# Altium integrated library Mastermind Devices.IntLib: 910 symbols (part 1 of 6)
Pins are listed as number, name and electrical type; pins without a type are passive.

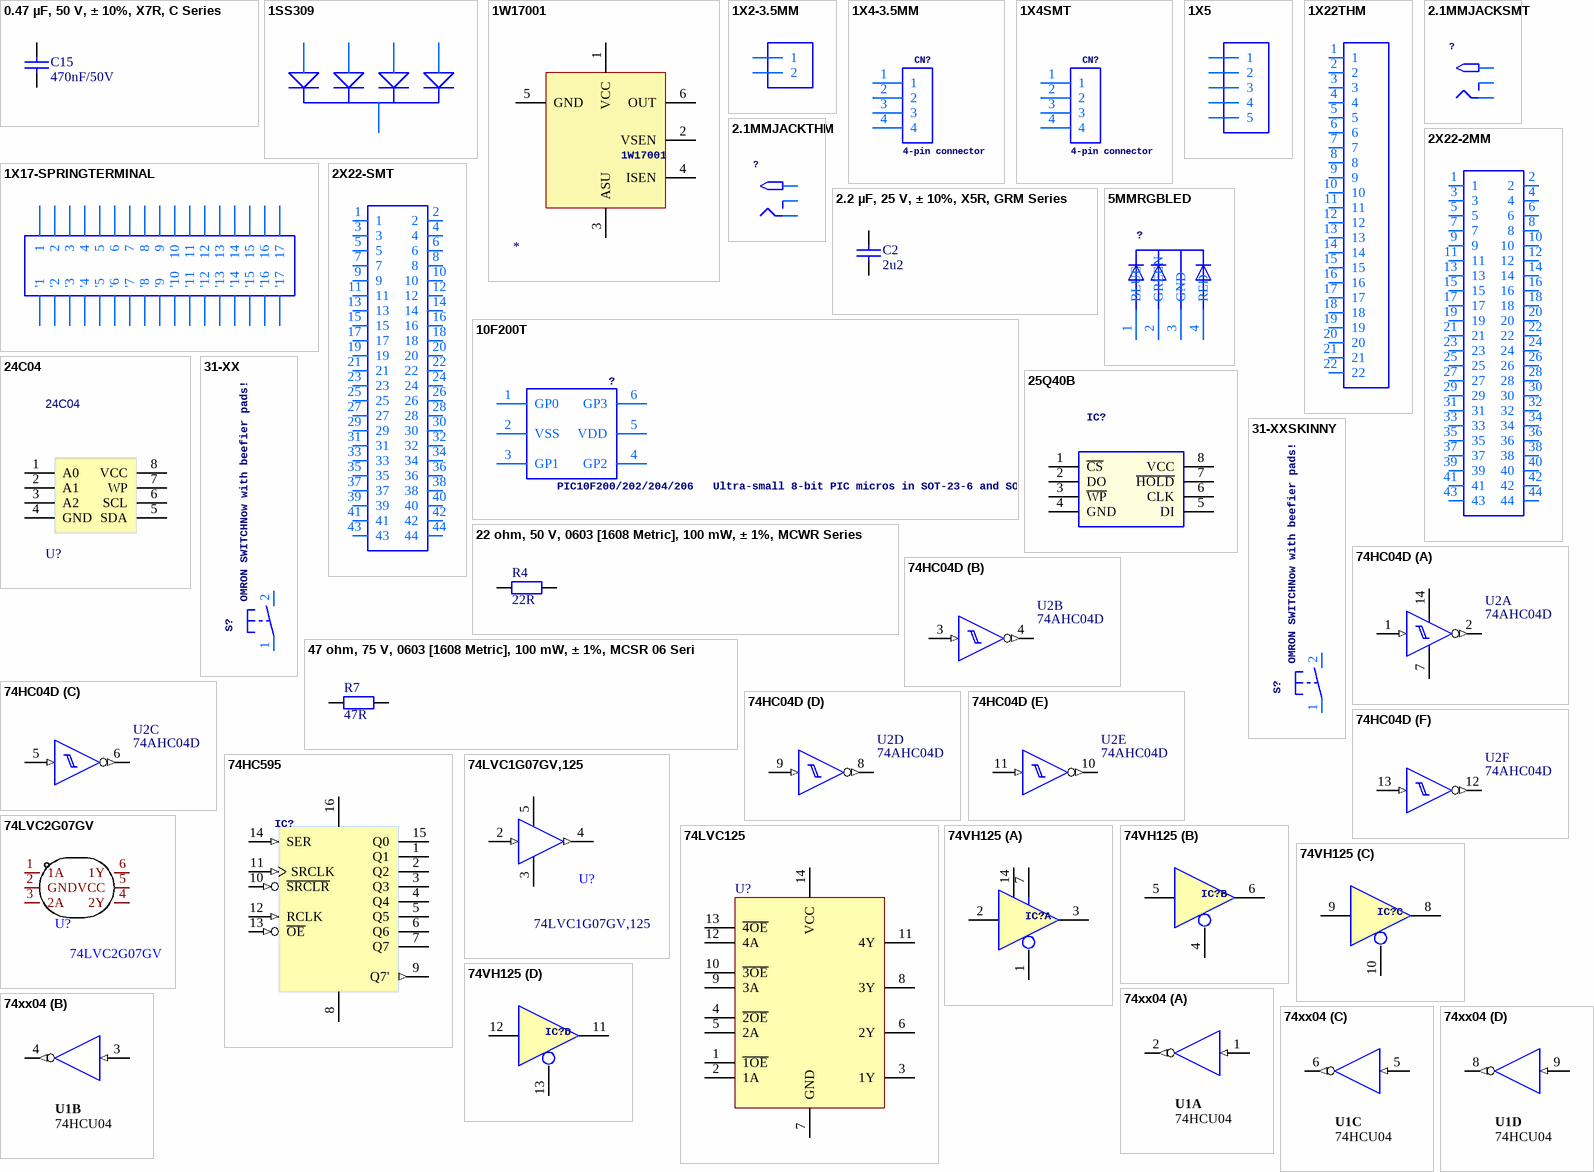
[diagram p0: symbols 0.47 µF, 50 V, ± 10%, X7R, C Series to 74xx04]

## 0.47 µF, 50 V, ± 10%, X7R, C Series
designator C15, comment 470nF/50V
SMD Multilayer Ceramic Capacitor, 0603 [1608 Metric], 0.47 µF, 50 V, ± 10%, X7R, C Series; MPN: C1608X7R1H474K080AC; Type: MLCC; VoltageRating: 50V; ComponentLinknDescription: Datasheet; MF: TDK; Capacitance: 470nF; Characteristic: *; ComponentLinknURL: *; Precision: 10%
footprint C0402 (0402 ceramic capacitor)
footprint C0603 (0603 ceramic capacitor)
footprint C0805 (0805 ceramic capacitor)
footprint C1206 (1206 ceramic capacitor)
footprint C1210 (1210 capacitor)
footprint C1812 (1812 capacitor)
pins: 1, 2

## 1SS309
designator D?
footprint SOT23-5L
pins: 1 A1, 2 C, 3 A2, 4 A3, 5 A4

## 1W17001
designator *
Parameter 1: *
pins: 1 VCC, 2 VSEN, 3 ASU, 4 ISEN, 5 GND, 6 OUT

## 1X2-3.5MM
designator J?, comment 3.5mm Terminal block    http://www.ladyada.net/library/pcb/eaglelibrary.html  (value not drawn)
footprint 1X2-3.5MM
pins: 1, 2

## 1X4-3.5MM
designator CN?, comment 4-pin connector
footprint 1X04-3.5MM
pins: 1, 2, 3, 4

## 1X4SMT
designator CN?, comment 4-pin connector
footprint 1X4-SMT
pins: 1, 2, 3, 4

## 1X5
designator J?
footprint 1X05-3.5MM
pins: 1, 2, 3, 4, 5

## 1X17-SPRINGTERMINAL
designator Q?
footprint SPRINGTERMINAL-17
pins: 1, 1' '1, 2, 2' '2, 3, 3' '3, 4, 4' '4, 5, 5' '5, 6, 6' '6, 7, 7' '7, 8, 8' '8, 9, 9' '9, 10, 10' '10, 11, 11' '11, 12, 12' '12, 13, 13' '13, 14, 14' '14, 15, 15' '15, 16, 16' '16, 17, 17' '17

## 1X22THM
designator ?
footprint 1X22
pins: 1, 2, 3, 4, 5, 6, 7, 8, 9, 10, 11, 12, 13, 14, 15, 16, 17, 18, 19, 20, 21, 22

## 2.1MMJACKSMT
designator ?, comment 2.1mm x 5.5mm THM DC jack with internal switch. Digikey part #PJ-102A, 4UCON part #05537  2.1mm x 5.5mm SMT DC jack with internal switch. Digikey part #PJ-002A-SMT, 4UCON part #03267    By microbuilder.eu & adafruit.com  (value not drawn)
footprint DCJACK_2MM_SMT
pins: GND RING, GNDBREAK RING_SW, PWR2 TIP

## 2.1MMJACKTHM
designator ?, comment 2.1mm x 5.5mm THM DC jack with internal switch. Digikey part #PJ-102A, 4UCON part #05537  2.1mm x 5.5mm SMT DC jack with internal switch. Digikey part #PJ-002A-SMT, 4UCON part #03267    By microbuilder.eu & adafruit.com  (value not drawn)
footprint PJ-102A
pins: RING, RING_SW, TIP

## 2.2 µF, 25 V, ± 10%, X5R, GRM Series
designator C2, comment 2u2
SMD Multilayer Ceramic Capacitor, 0603 [1608 Metric], 2.2 µF, 25 V, ± 10%, X5R, GRM Series; MPN: GRM188R61E225KA12D; Type: MLCC; Voltage rating: 50V; ComponentLinknDescription: Datasheet; MF: MURATA; Characteristic: *; ComponentLinknURL: *; Capacitance: 2u2; Precision: 10%
footprint C0402 (0402 ceramic capacitor)
footprint C0603 (0603 ceramic capacitor)
footprint C0805 (0805 ceramic capacitor)
footprint C1206 (1206 ceramic capacitor)
footprint C1210 (1210 capacitor)
footprint C1812 (1812 capacitor)
pins: 1, 2

## 2X22-2MM
designator ?
footprint 2X22
pins: 1, 2, 3, 4, 5, 6, 7, 8, 9, 10, 11, 12, 13, 14, 15, 16, 17, 18, 19, 20, 21, 22, 23, 24, 25, 26, 27, 28, 29, 30, 31, 32, 33, 34, 35, 36, 37, 38, 39, 40, 41, 42, 43, 44

## 2X22-SMT
designator ?
footprint 2X22-SMT
pins: 1, 2, 3, 4, 5, 6, 7, 8, 9, 10, 11, 12, 13, 14, 15, 16, 17, 18, 19, 20, 21, 22, 23, 24, 25, 26, 27, 28, 29, 30, 31, 32, 33, 34, 35, 36, 37, 38, 39, 40, 41, 42, 43, 44

## 5MMRGBLED
designator ?
footprint LED5MMRGB
pins: 1 BLUE, 2 GREEN, 3 GND, 4 RED

## 10F200T
designator ?, comment PIC10F200/202/204/206   Ultra-small 8-bit PIC micros in SOT-23-6 and SOIC
footprint SOT23-6
pins: 1 GP0, 2 VSS (power), 3 GP1, 4 GP2, 5 VDD (power), 6 GP3

## 22 ohm, 50 V, 0603 [1608 Metric], 100 mW, ± 1%, MCWR Series
designator R4, comment Resistance: 22R  (hidden comment: 22R / 100mW / 1%)
SMD Chip Resistor, Thick Film, 22 ohm, 50 V, 0603 [1608 Metric], 100 mW, ± 1%, MCWR Series; MPN: MCWR06X22R0FTLV; Temp coefficient: *ppm; MF: MULTICOMP; Precision: 1%; PowerRating: 100mW; Manufacturer: *; ComponentLinknURL: *
footprint R0402 (0402 resistor)
footprint R0603 (0603 resistor)
footprint R0805 (0805 resistor)
footprint R1206 (1206 resistor)
footprint R2512 (2512 resistor)
footprint R0201 (0201 resistor)
footprint R1210 (1210 resistor)
footprint R1812 (1812 resistor)
footprint R2010 (2010 resistor)
footprint R2512 (2512 resistor)
pins: 1, 2

## 24C04
designator U?
24C04 EEPROM; Manufacturer: HK(航顺); Manufacturer Part: HK24C04; Contributor: LCSC; Supplier: LCSC; Supplier Part: C495285; JLCPCB Part Class: Extended Part; spicePre: U; spiceSymbolName: HK24C04
footprint SOP8
pins: 1 A0, 2 A1, 3 A2, 4 GND, 5 SDA, 6 SCL, 7 WP, 8 VCC

## 25Q40B
designator IC?
footprint SOIC-8E (SOIC, 8-Leads, Body 4.90x3.90mm, Pitch 1.27mm, IPC Medium Density)
pins: 1 ~{CS}, 2 DO, 3 ~{WP}, 4 GND, 5 DI, 6 CLK, 7 ~{HOLD}, 8 VCC

## 31-XX
designator S?, comment OMRON SWITCHNow with beefier pads!
footprint B3F-31XX
pins: 1 P, 2 S

## 31-XXSKINNY
designator S?, comment OMRON SWITCHNow with beefier pads!
footprint B3F-31XX-SKINNIER
pins: 1 P, 2 S

## 47 ohm, 75 V, 0603 [1608 Metric], 100 mW, ± 1%, MCSR 06 Series
designator R7, comment Resistance: 47R  (hidden comment: 47R /  / 1%)
SMD Chip Resistor, Ceramic, 47 ohm, 75 V, 0603 [1608 Metric], 100 mW, ± 1%, MCSR 06 Series; MPN: MCSR06X47R0FTL; Temp coefficient: *ppm; MF: MULTICOMP; Precision: 1%; Manufacturer: *; ComponentLinknURL: *
footprint R0402 (0402 resistor)
footprint R0603 (0603 resistor)
footprint R0805 (0805 resistor)
footprint R1206 (1206 resistor)
footprint R2512 (2512 resistor)
footprint R0201 (0201 resistor)
footprint R1210 (1210 resistor)
footprint R1812 (1812 resistor)
footprint R2010 (2010 resistor)
footprint R2512 (2512 resistor)
pins: 1, 2

## 74HC04D
designator U2, comment 74AHC04D
Inverter IC 6 Channel 14-SOIC; BOM_Manufacturer: TI(德州仪器); subpart_no: 1; Contributor: LCSC; BOM_Supplier: LCSC; BOM_JLCPCB Part Class: Extended Part; spicePre: U; spiceSymbolName: SN74AHCT1G125DBVT DH
footprint SOIC127P600X175-14N
part A pins: 1 A (in), 2 Y (out), 7 GND, 14 VCC
part B pins: 3 A (in), 4 Y (out)
part C pins: 5 A (in), 6 Y (out)
part D pins: 8 Y (out), 9 A (in)
part E pins: 10 Y (out), 11 A (in)
part F pins: 12 Y (out), 13 A (in)

## 74HC595
designator IC?  (value not drawn)
Shift Register; GateName_1: G$1; SymbolName_1: MAX232
footprint SO-16
pins: 1 Q1, 2 Q2, 3 Q3, 4 Q4, 5 Q5, 6 Q6, 7 Q7, 8 GND, 9 Q7' (out), 10 ~{SRCLR} (in), 11 SRCLK (in), 12 RCLK (in), 13 ~{OE} (in), 14 SER (in), 15 Q0, 16 VCC

## 74LVC1G07GV,125
designator U?
Manufacturer: Nexperia(安世); Add into BOM: yes; output type: Open Drain; Supply Voltage: 1.65V~5.5V; Number of Elements: 1; Sink Current: 32mA; Logic Family: 74LVC; Symbol: 74LVC1G07GV,125; Device: 74LVC1G07GV,125; LCSC Part Name: 74LVC1G07GV,125; Supplier Part: C12511; Manufacturer Part: 74LVC1G07GV,125; Supplier Footprint: SOT-753; JLCPCB Part Class: Extended Part; Datasheet: https://atta.szlcsc.com/upload/public/pdf/source/20130521/1457706602667.pdf; Supplier: LCSC; Convert to PCB: yes; Number of Bits per Element: 1; Operating Temperature: -40℃~+125℃
footprint SOT23-5L
pins: 2 A (in), 3 GND, 4 Y (out), 5 VCC

## 74LVC2G07GV
designator U?
Manufacturer: TECH PUBLIC(台舟); Add into BOM: yes; Symbol: 74LVC2G07GV; Device: 74LVC2G07GV; LCSC Part Name: 74LVC2G07GV; Supplier Part: C19829597; Manufacturer Part: 74LVC2G07GV; Supplier Footprint: SOT-23-6; Datasheet: https://atta.szlcsc.com/upload/public/pdf/source/20240202/A0B51486A7A10E25A0B1630C875E8EFF.pdf; Supplier: LCSC; Convert to PCB: yes
footprint SOT23-6
pins: 1 1A, 2 GND, 3 2A, 4 2Y, 5 VCC, 6 1Y

## 74LVC125
designator U?, comment LOGIC LEVEL CONVERTER  (value not drawn)
XCF00S Series, Platform Flash In-System Programmable Configuration 3.3V PROM, 20-Pin TSOP, 2-Megabit, Commercial Grade; PackageDocument: ver1.0, May-2003; AEMS Code: CHANGED VALUE; DatasheetDocument: ver2.3, May-2004; PackageReference: VO20; Code_JEDEC: MO-153-AC
footprint TSSOP14
pins: 1 ~{1OE} "Configuration Pulse (Open-Drain Output).", 2 1A "Ground", 3 1Y "Leave Unconnected.", 4 ~{2OE} "Configuration Pulse (Open-Drain Output).", 5 2A "Ground", 6 2Y "Leave Unconnected.", 7 GND (power) "Ground", 8 3Y "Leave Unconnected.", 9 3A "Ground", 10 ~{3OE} "Configuration Pulse (Open-Drain Output).", 11 4Y "Serial Data Output, for configuring an FPGA in serial mode.", 12 4A "Ground", 13 ~{4OE} "Configuration Pulse (Open-Drain Output).", 14 VCC (power) "Ground"

## 74VH125
designator IC?, comment Quad bus BUFFER, 3-state  (value not drawn)
footprint TSSOP14
part A pins: 1 OE, 2 I, 3 O (hiz), 7 I, 14 I
part B pins: 4 OE, 5 I, 6 O (hiz)
part C pins: 8 O (hiz), 9 I, 10 OE
part D pins: 11 O (hiz), 12 I, 13 OE

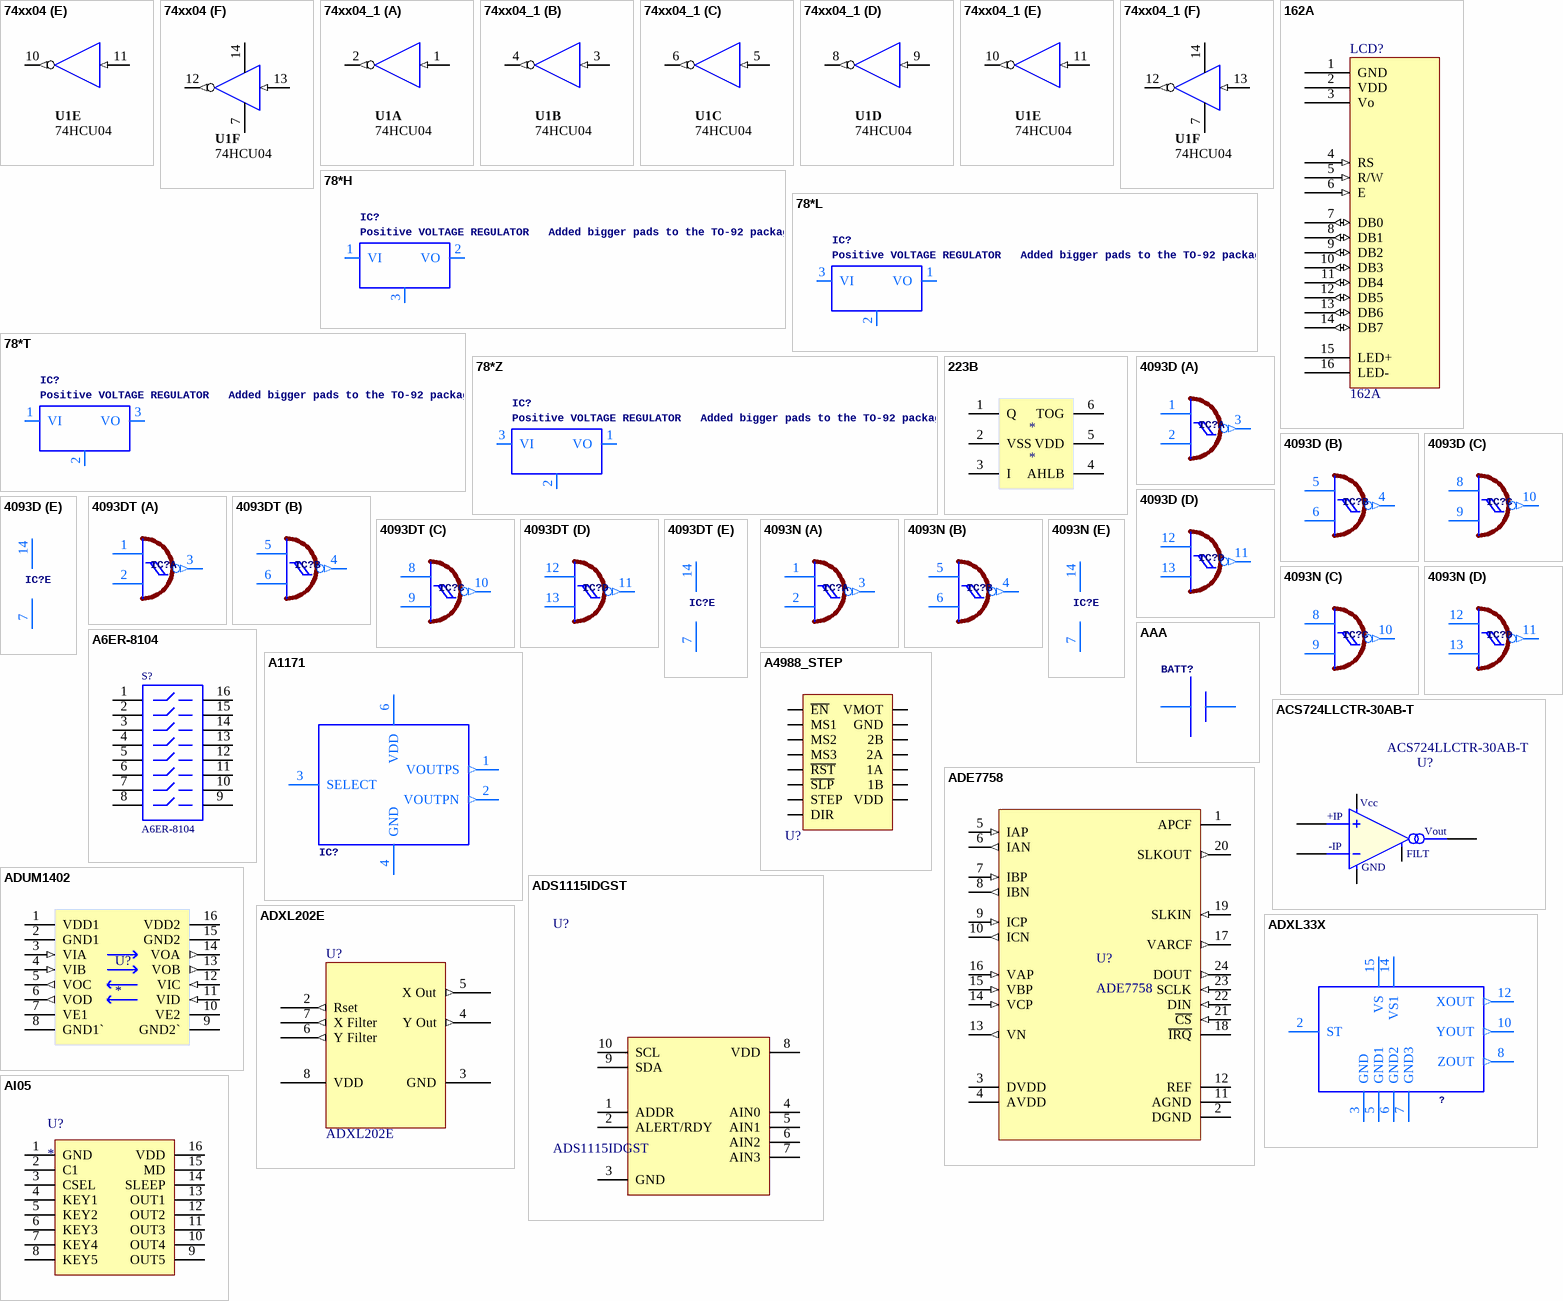
[diagram p1: symbols 74xx04 to AI05]

## 74xx04
designator U1, comment 74HCU04
74HCU04, HEX Inverter, Unbuffered; Mounting Technology: Surface Mount; Status: Production; Category: IC-Logic
footprint SOIC127P600-14
footprint TSSOP14
part A pins: 1 A (in), 2 Y (out)
part B pins: 3 A (in), 4 Y (out)
part C pins: 5 A (in), 6 Y (out)
part D pins: 8 Y (out), 9 A (in)
part E pins: 10 Y (out), 11 A (in)
part F pins: 7 GND (power), 12 Y (out), 13 A (in), 14 VCC (power)

## 74xx04_1
designator U1, comment 74HCU04
74HCU04, HEX Inverter, Unbuffered; Mounting Technology: Surface Mount; Status: Production; Category: IC-Logic
footprint SOIC127P600-14
footprint TSSOP14
part A pins: 1 A (in), 2 Y (out)
part B pins: 3 A (in), 4 Y (out)
part C pins: 5 A (in), 6 Y (out)
part D pins: 8 Y (out), 9 A (in)
part E pins: 10 Y (out), 11 A (in)
part F pins: 7 GND (power), 12 Y (out), 13 A (in), 14 VCC (power)

## 78*H
designator IC?, comment Positive VOLTAGE REGULATOR   Added bigger pads to the TO-92 package
footprint TO39
pins: 1 VI, 2 VO, 3 GND

## 78*L
designator IC?, comment Positive VOLTAGE REGULATOR   Added bigger pads to the TO-92 package
footprint TO92
pins: 1 VO, 2 GND, 3 VI

## 78*T
designator IC?, comment Positive VOLTAGE REGULATOR   Added bigger pads to the TO-92 package
footprint TO220H
pins: 1 VI, 2 GND, 3 VO

## 78*Z
designator IC?, comment Positive VOLTAGE REGULATOR   Added bigger pads to the TO-92 package
footprint TO92
pins: 1 VO, 2 GND, 3 VI

## 162A
designator LCD?
16 char * 2 line LCD character display with b/light
3D model 162a (PCB3D Model)
footprint 162A
pins: 1 GND (power) "VSS - 0V", 2 VDD (power) "VDD - 5V", 3 Vo (hiz) "Input Voltage For LCD", 4 RS (in) "H = Data Signal, L = Instrunction Signal", 5 R/W (in) "H = Read Mode, L = Write Mode", 6 E (in) "Chip Enable (H, H->L)", 7 DB0 (io) "Chip Enable (H, H->L)", 8 DB1 (io) "Chip Enable (H, H->L)", 9 DB2 (io) "Chip Enable (H, H->L)", 10 DB3 (io) "Chip Enable (H, H->L)", 11 DB4 (io) "Chip Enable (H, H->L)", 12 DB5 (io) "Chip Enable (H, H->L)", 13 DB6 (io) "Chip Enable (H, H->L)", 14 DB7 (io) "Chip Enable (H, H->L)", 15 LED+ (power) "LED Backlight +", 16 LED- (power) "LED Backlight -"

## 223B
designator *
footprint SOT23-6
pins: 1 Q, 2 VSS, 3 I, 4 AHLB, 5 VDD, 6 TOG

## 4093D
designator IC?, comment Quad 2-input NAND schmitt trigger  (value not drawn)
footprint SO14
part A pins: 1 I0, 2 I1, 3 O (out)
part B pins: 4 O (out), 5 I0, 6 I1
part C pins: 8 I0, 9 I1, 10 O (out)
part D pins: 11 O (out), 12 I0, 13 I1
part E pins: 7 VSS (power), 14 VDD (power)

## 4093DT
designator IC?, comment Quad 2-input NAND schmitt trigger  (value not drawn)
footprint MC14093B-TSSOP14
part A pins: 1 I0, 2 I1, 3 O (out)
part B pins: 4 O (out), 5 I0, 6 I1
part C pins: 8 I0, 9 I1, 10 O (out)
part D pins: 11 O (out), 12 I0, 13 I1
part E pins: 7 VSS (power), 14 VDD (power)

## 4093N
designator IC?, comment Quad 2-input NAND schmitt trigger  (value not drawn)
footprint DIL14
part A pins: 1 I0, 2 I1, 3 O (out)
part B pins: 4 O (out), 5 I0, 6 I1
part C pins: 8 I0, 9 I1, 10 O (out)
part D pins: 11 O (out), 12 I0, 13 I1
part E pins: 7 VSS (power), 14 VDD (power)

## A6ER-8104
designator S?
DIP Switch Side actuator long liver Piano Key; Revision: July-2002: Re-released for DXP Platform.
footprint DIP-16-KEY
simulation model dpsw8 (Spice Subcircuit)
3D model SWITCH_DIP8 (PCB3D Model)
pins: 1, 2, 3, 4, 5, 6, 7, 8, 9, 10, 11, 12, 13, 14, 15, 16

## A1171
designator IC?, comment A1171 Allegro push-pull hall effect sensor  (value not drawn)
footprint DFN-6
pins: 1 VOUTPS (out), 2 VOUTPN (out), 3 SELECT, 4 GND (power), 6 VDD (power)

## A4988_STEP
designator U?  (value not drawn)
GateName_1: G$1; SymbolName_1: A4988_STEP; LibraryName: IC; DeviceSetName: A4988_STEP; Package: A4988_STEP
footprint A4988_STEP
pins: 1A, 1B, 2A, 2B, /EN ~{EN}, /RST ~{RST}, /SLP ~{SLP}, DIR, GND, MS1, MS2, MS3, STEP, VDD, VMOT

## AAA
designator BATT?, comment AAA PC pin holder   Mouser part #12BH412 - but pretty much any 1x AAA battery holder should be the same    http://www.ladyada.net/library/pcb/eaglelibrary.html  (value not drawn)
footprint 12BH412
pins: +, -

## ACS724LLCTR-30AB-T
designator U?
Manufacturer: ALLEGRO(美国埃戈罗); Add into BOM: yes; Current Range: 30A; Supply Voltage: 4.5V~5.5V; Sensitivity: 66mV/A; Symbol: ACS724LLCTR-30AB-T; Device: ACS724LLCTR-30AB-T; LCSC Part Name: ACS724LLCTR-30AB-T; Supplier Part: C141715; Manufacturer Part: ACS724LLCTR-30AB-T; Supplier Footprint: SOIC-8; JLCPCB Part Class: Extended Part; Datasheet: https://atta.szlcsc.com/upload/public/pdf/source/20200518/C459328_30972F681B164683FED19A924BE04160.pdf; Supplier: LCSC; Convert to PCB: yes; Operating Temperature: -40℃~+150℃
footprint SOIC-8_L4.9-W3.9-P1.27-LS6.0-BL; pin to pad 1>1+2 3>3+4
pins: 1 A+, 3 A-, 5 GND, 6 OA, 7 OA, 8 VCC
text: Vcc; +IP; Vout; -IP; FILT

## ADE7758
designator U?
footprint SOIC24 (SOIC, 8-Leads, Body 4.90x3.90mm, Pitch 1.27mm, IPC Medium Density)
pins: 1 APCF, 2 DGND, 3 DVDD, 4 AVDD, 5 IAP (in), 6 IAN (out), 7 IBP (in), 8 IBN (out), 9 ICP (in), 10 ICN (out), 11 AGND, 12 REF, 13 VN (out), 14 VCP (in), 15 VBP (in), 16 VAP (in), 17 VARCF (out), 18 ~{IRQ}, 19 SLKIN (in), 20 SLKOUT (out), 21 ~{CS} (in), 22 DIN (in), 23 SCLK (in), 24 DOUT (out)

## ADS1115IDGST
designator U?
16-Bit Analog to digital Converter; DETAILS: 16 Bit Analog to Digital Converter 2, 4 Input 1 Sigma-Delta 10-VSSOP; MFG: Texas Instruments; VALUE: 16 Bit Analog to Digital Converter; MFGPN: ADS1115IDGST; PACKAGE: 10VSSOP; URL: https://www.digikey.com/en/products/detail/texas-instruments/ADS1115IDGST/2123284?s=N4IgTCBcDaIIIBEDKBGNBWAkgg4kgKiALoC%2BQA
footprint SOP50P490X110-10N
footprint SOP50P490X110-10N
pins: 1 ADDR, 2 ALERT/RDY, 3 GND (power), 4 AIN0, 5 AIN1, 6 AIN2, 7 AIN3, 8 VDD (power), 9 SDA, 10 SCL

## ADUM1402
designator U?
General Purpose Digital Isolator 2500Vrms 4 Channel 1Mbps 25kV/Âµs CMTI 16-SOIC (0.295, 7.50mm Width); MP: ADUM1402; MF: Analog Devices; Value: *; Check_prices: https://www.snapeda.com/parts/ADUM1402/Analog%20Devices%20Inc./view-part/564744/?ref=eda; Package: SOIC-16 Analog Devices; Availability: Bad; Price: None; SnapEDA_Link: https://www.snapeda.com/parts/ADUM1402/Analog%20Devices%20Inc./view-part/564744/?ref=snap
footprint SO16W
pins: 1 VDD1 (power), 2 GND1 (power), 3 VIA (in), 4 VIB (in), 5 VOC (out), 6 VOD (out), 7 VE1, 8 GND1` (power), 9 GND2` (power), 10 VE2, 11 VID (in), 12 VIC (in), 13 VOB (out), 14 VOA (out), 15 GND2 (power), 16 VDD2 (power)

## ADXL33X
designator ?
footprint 16LCSP
pins: 2 ST, 3 GND (oe), 5 GND1 (oe), 6 GND2 (oe), 7 GND3 (oe), 8 ZOUT (out), 10 YOUT (out), 12 XOUT (out), 14 VS1 (oe), 15 VS (oe)

## ADXL202E
designator U?
Accelerometer with Digital Output
footprint E-8
pins: 1 Self Test (in) hidden, 2 Rset (out), 3 GND (power), 4 Y Out (out), 5 X Out (out), 6 Y Filter (out), 7 X Filter (out), 8 VDD (power)

## AI05
designator U?
SOP-16_L10.0-W3.9-P1.27-LS6.0-BL; MF: Vishay Semiconductor; MP: TCMT4606; Digi-Key_Part_Number: TCMT4606CT-ND; DigiKey-Purchase-URL: https://snapeda.com/shop?store=DigiKey&id=649284; Package: SOP-16 Vishay; Value: *; SnapEDA_Link: https://www.snapeda.com/parts/TCMT4606/Vishay%20Semiconductor%20Opto%20Division/view-part/649284/?ref=snap
footprint SO-16
pins: 1 GND, 2 C1, 3 CSEL, 4 KEY1, 5 KEY2, 6 KEY3, 7 KEY4, 8 KEY5, 9 OUT5, 10 OUT4, 11 OUT3, 12 OUT2, 13 OUT1, 14 SLEEP, 15 MD, 16 VDD

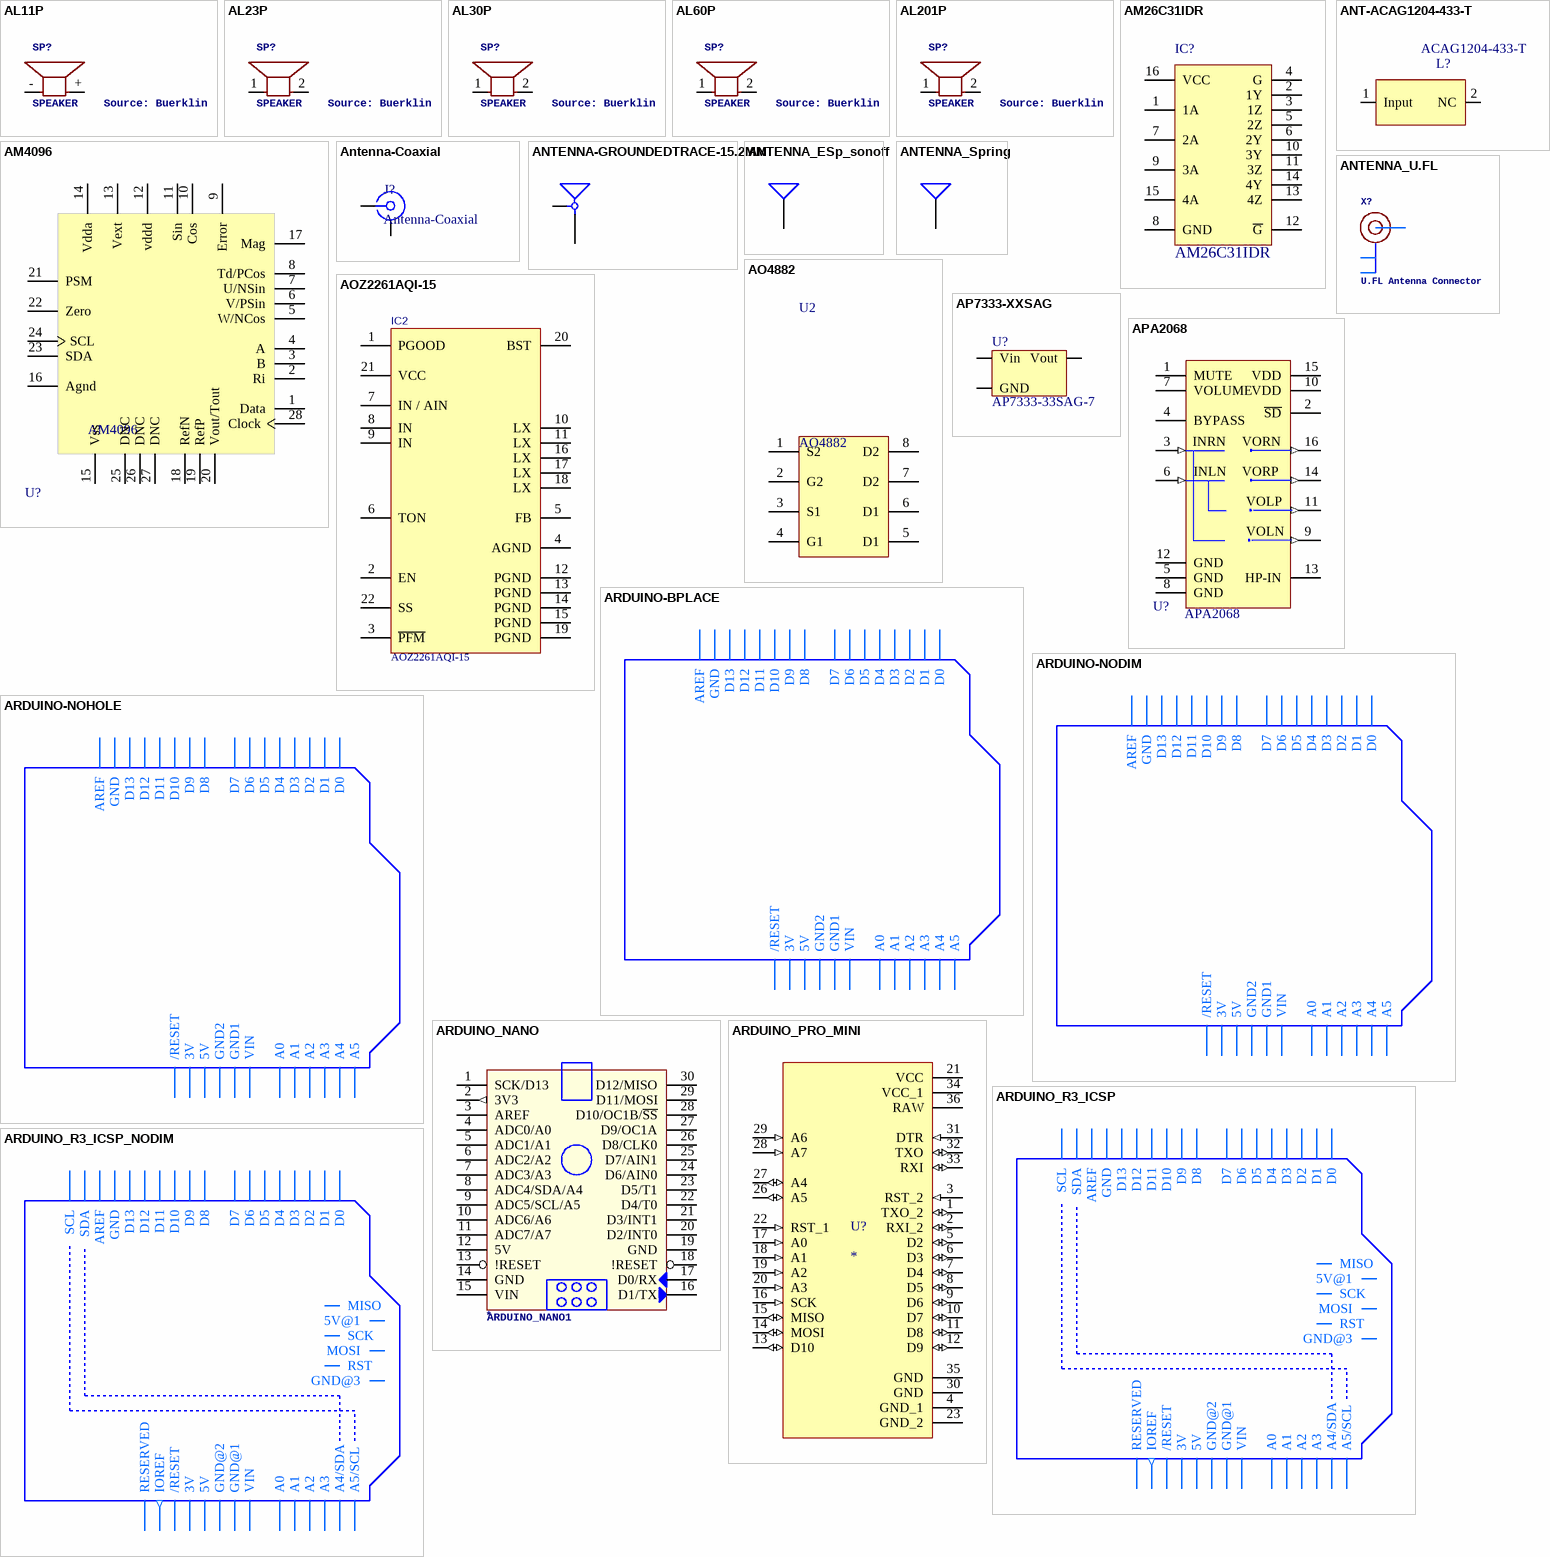
[diagram p2: symbols AL11P to ARDUINO_R3_ICSP_NODIM]

## AL11P
designator SP?, comment SPEAKER    Source: Buerklin
OC_FARNELL: unknown; OC_NEWARK: unknown
footprint AL11P
pins: + 2, - 1

## AL23P
designator SP?, comment SPEAKER    Source: Buerklin
OC_FARNELL: unknown; OC_NEWARK: unknown
footprint AL23P
pins: 1, 2

## AL30P
designator SP?, comment SPEAKER    Source: Buerklin
OC_FARNELL: unknown; OC_NEWARK: unknown
footprint AL30P
pins: 1, 2

## AL60P
designator SP?, comment SPEAKER    Source: Buerklin
OC_FARNELL: unknown; OC_NEWARK: unknown
footprint AL60P
pins: 1, 2

## AL201P
designator SP?, comment SPEAKER    Source: Buerklin
OC_FARNELL: unknown; OC_NEWARK: unknown
footprint AL201P
pins: 1, 2

## AM26C31IDR
designator IC?
SOIC-16 Buffers, Drivers, Receivers, Transceivers ROHS
footprint SO-16
pins: 1 1A, 2 1Y, 3 1Z, 4 G, 5 2Z, 6 2Y, 7 2A, 8 GND, 9 3A, 10 3Y, 11 3Z, 12 ~{G}, 13 4Z, 14 4Y, 15 4A, 16 VCC

## AM4096
designator U?
Integrated Circuit
footprint SOP65P780X200-28N
pins: 1 Data, 2 Ri, 3 B, 4 A, 5 W/NCos, 6 V/PSin, 7 U/NSin, 8 Td/PCos, 9 Error, 10 Cos, 11 Sin, 12 vddd, 13 Vext, 14 Vdda, 15 Vss, 16 Agnd, 17 Mag, 18 RefN, 19 RefP, 20 Vout/Tout, 21 PSM, 22 Zero, 23 SDA, 24 SCL, 25 DNC, 26 DNC, 27 DNC, 28 Clock

## ANT-ACAG1204-433-T
designator L?, comment ACAG1204-433-T
2 Chip Antenna -1.72dBi 433MHz SMD,12x4mm Antennas ROHS; Manufacturer: ABRACON; Add into BOM: yes; VSWR: 2; Symbol: ACAG1204-433-T; Device: ACAG1204-433-T; LCSC Part Name: ACAG1204-433-T; Supplier Part: C6113830; Manufacturer Part: ACAG1204-433-T; Supplier Footprint: SMD,12x4mm; JLCPCB Part Class: Extended Part; Datasheet: https://atta.szlcsc.com/upload/public/pdf/source/20240327/80E5ABA0D6706D2FCBCF1E29EBE2A1AE.pdf; Supplier: LCSC; Convert to PCB: yes; Antenna Type: Chip Antenna; Central Frequency: 433MHz; Peak Gain: -1.72dBi
footprint ANT-SMD_L12.0-W4.0_ACAG1204-915-T
3D model ANT-SMD_L12.0-W4.0_ACAG1204-915-T
pins: 1 Input, 2 NC

## Antenna-Coaxial
designator J?
pins: 1 Signal, 2 GND/SHIELD

## ANTENNA-GROUNDEDTRACE-15.2MM
designator E?  (net tie, no BOM)
Inverted F TRACE_ANTENNA_2.4GHZ_25.7MM
footprint TRACE_ANTENNA_2.4GHZ_15.2MM
pins: ANT A, GND

## ANTENNA_ESp_sonoff
designator ANT?  (net tie, no BOM)
Meander
footprint ANT-ESP12F- sonoff
pins: FEED A

## ANTENNA_Spring
designator ANT?  (net tie, no BOM)
Spring
footprint ANT-SPRING
pins: FEED A

## ANTENNA_U.FL
designator X?, comment U.FL Antenna Connector
footprint U.FL
pins: 1 GND@0, 2 GND@1, 3 SIGNAL

## AO4882
designator U2
40V Dual N-Channel Mosfet
footprint SOP127P600X170-8L (SOP, 8-Leads, Body 4,90x3,90mm, Pitch 1,27mm, IPC High Density)
pins: 1 S2, 2 G2, 3 S1, 4 G1, 5 D1, 6 D1, 7 D2, 8 D2

## AOZ2261AQI-15
designator IC2
8A (Iout(max)) Synchronous Buck Regulator, QFN-22L (4mmx 4mm), Vin = 4V to 28V; Manufacturer Name: Alpha and Omega; Manufacturer Part No.: AOZ2261AQI-15
footprint T_QFN50P400X400X100-22N
pins: 1 PGOOD (power), 2 EN (power), 3 ~{PFM} (power), 4 AGND (power), 5 FB (power), 6 TON (power), 7 IN / AIN (power), 8 IN (power), 9 IN (power), 10 LX (power), 11 LX (power), 12 PGND (power), 13 PGND (power), 14 PGND (power), 15 PGND (power), 16 LX (power), 17 LX (power), 18 LX (power), 19 PGND (power), 20 BST (power), 21 VCC (power), 22 SS (power)

## AP7333-XXSAG
designator U?, comment AP7333-33SAG-7
300mA, Low Quiescent Current, Fast Transient Low Dropout Linear Regulator; Manufacturer: Diodes Incorporated; Artikkelnr Noca: 17039216; Artikkelnr Simpro: N.A.; Part Number: AP7333-33SAG-7; Manufacturer Part Number: AP7333-33SAG-7; Datasheet: http://www.diodes.com/datasheets/AP7333.pdf; LatestRevisionDate: 2012-06-15; Pin Count: 3; Publisher: Nordic Semiconductor; Published: 2012-06-15; Value: AP7333-33SAG-7; Note: *; Supplier: Digi-Key; Supplier part number: AP7333-33SAG-7DICT-ND; 2nd source Supplier: *; 2nd source part number: *; Footprint Doc: SOT-23-3
footprint SOT-23A
pins: 1 Vin, 2 Vout, 3 GND

## APA2068
designator U?
Class AB 2-Channel (Stereo) 2.9W x 2 @ 3Ω 4.5 V ~ 5.5 V SOIC-16_150mil Audio Power OpAmps RoHS; GateName_1: G$1; SymbolName_1: APA2068
footprint SO-16
pins: 1 MUTE, 2 ~{SD}, 3 T1IN (in), 4 BYPASS, 5 GND (power), 6 T2IN (in), 7 VOLUME, 8 GND (power), 9 VOLN (out), 10 VDD (power), 11 VOLP (out), 12 GND, 13 HP-IN, 14 VORP (out), 15 VDD (power), 16 VORN (out)
text: INRN; INLN

## ARDUINO-BPLACE
designator ?, comment Arduino Diecimila/Duemilanove   Make a shield with ease, this package has all the named pins as well as the two mounting drill holes and an outline of the USB and DC power connector. The outline is on the DIMENSION layer, so if your board house uses it they will cut the outline to match.    http://www.ladyada.net/library/pcb/eaglelibrary.html  (value not drawn)
footprint ARDUINO-BPLACE
pins: 3V (power), 5V (power), A0, A1, A2, A3, A4, A5, AREF, D0, D1, D2, D3, D4, D5, D6, D7, D8, D9, D10, D11, D12, D13, GND (power), GND1 (power), GND2 (power), RESET /RESET, VIN (power)

## ARDUINO-NODIM
designator ?, comment Arduino Diecimila/Duemilanove   Make a shield with ease, this package has all the named pins as well as the two mounting drill holes and an outline of the USB and DC power connector. The outline is on the DIMENSION layer, so if your board house uses it they will cut the outline to match.    http://www.ladyada.net/library/pcb/eaglelibrary.html  (value not drawn)
footprint ARDUINO-NODIM
pins: 3V (power), 5V (power), A0, A1, A2, A3, A4, A5, AREF, D0, D1, D2, D3, D4, D5, D6, D7, D8, D9, D10, D11, D12, D13, GND (power), GND1 (power), GND2 (power), RESET /RESET, VIN (power)

## ARDUINO-NOHOLE
designator ?, comment Arduino Diecimila/Duemilanove   Make a shield with ease, this package has all the named pins as well as the two mounting drill holes and an outline of the USB and DC power connector. The outline is on the DIMENSION layer, so if your board house uses it they will cut the outline to match.    http://www.ladyada.net/library/pcb/eaglelibrary.html  (value not drawn)
footprint ARDUINO-NOHOLE
pins: 3V (power), 5V (power), A0, A1, A2, A3, A4, A5, AREF, D0, D1, D2, D3, D4, D5, D6, D7, D8, D9, D10, D11, D12, D13, GND (power), GND1 (power), GND2 (power), RESET /RESET, VIN (power)

## ARDUINO_NANO
designator ARDUINO_NANO1  (value not drawn)
Arduino Nano V3.0 ModuleOverview:The Arduino Nano is a small, complete, and breadboard-friendly board based on the ATmega328 (Arduino Nano 3.x) or ATmega168 (Arduino Nano 2.x). It has more or less the same functionality of the Arduino Duemilanove, but in a different package.It lacks only a DC power jack, and works with a Mini-B USB cable instead of a standard one.The Nano was designed and is being produced by Gravitech.  General specifications:    Item    Value        Microcontroller    Atmel ATmega168 or ATmega328        Operating Voltage (logic level)    5 V        Input Voltage (recommended)    7-12 V      Input Voltage (limits)    6-20 V      Digital I/O Pins    14 (of which 6 provide PWM output)      Analog Input Pins    8      DC Current per I/O Pin    40 mA        Flash Memory    16 KB (ATmega168) or 32 KB (ATmega328) of which 2 KB used by bootloader        SRAM    1 KB (ATmega168) or 2 KB (ATmega328)        EEPROM    512 bytes (ATmega168) or 1 KB (ATmega328)        Clock Speed    16 MHz        Dimensions (Inches)     0.73" x 1.70"        Dimensions (mm)     18mm x 45mm        Overall height    About 9 mm (not including pins)        Weigth    5 g  Power:The Arduino Nano can be powered via the Mini-B USB connection, 6-20V unregulated external power supply (pin 30), or 5V regulated external power supply (pin 27).The power source is automatically selected to the highest voltage source.Memory:The ATmega168 has 16 KB of flash memory for storing code (of which 2 KB is used for the bootloader); the ATmega328 has 32 KB, (also with 2 KB used for the bootloader).The ATmega168 has 1 KB of SRAM and 512 bytes of EEPROM (which can be read and written with the EEPROM library); the ATmega328 has 2 KB of SRAM and 1 KB of EEPROM.Input and Output:Each of the 14 digital pins on the Nano can be used as an input or output, using pinMode(), digitalWrite(), and digitalRead() functions.They operate at 5 volts.Each pin can provide or receive a maximum of 40 mA and has an internal pull-up resistor (disconnected by default) of 20-50 kOhms. In addition, some pins have specialized functions.Visit Arduino - ArduinoBoardNano; GateName_1: G$1; SymbolName_1: ARDUINO_NANO; LibraryName: ArduinoNanoV30; DeviceSetName: ARDUINO_NANO; NAME: *
footprint ARDUINO_NANO
pins: 1 SCK/D13, 2 3V3 (out), 3 AREF, 4 ADC0/A0, 5 ADC1/A1, 6 ADC2/A2, 7 ADC3/A3, 8 ADC4/SDA/A4, 9 ADC5/SCL/A5, 10 ADC6/A6, 11 ADC7/A7, 12 5V (power), 13 !RESET, 14 GND (power), 15 VIN (power), 16 D1/TX, 17 D0/RX, 18 !RESET, 19 GND (power), 20 D2/INT0, 21 D3/INT1, 22 D4/T0, 23 D5/T1, 24 D6/AIN0, 25 D7/AIN1, 26 D8/CLK0, 27 D9/OC1A, 28 D10/OC1B/~{SS}, 29 D11/MOSI, 30 D12/MISO

## ARDUINO_PRO_MINI
designator U?
This board was developed for applications and installations where space is premium and projects are made as permanent set ups. Small, available in 3.3 V and 5 V versions, powered by ATmega328P.; MP: Arduino Pro Mini; MF: Arduino; Price: None; Availability: Not in stock; Package: None; Value: *; SnapEDA_Link: https://www.snapeda.com/parts/Arduino%20Pro%20Mini/Arduino/view-part/?ref=snap; Check_prices: https://www.snapeda.com/parts/Arduino%20Pro%20Mini/Arduino/view-part/?ref=eda
footprint MODULE_ARDUINO_PRO_MINI
pins: 1 TXO_2 (io), 2 RXI_2 (io), 3 RST_2 (in), 4 GND_1 (power), 5 D2 (io), 6 D3 (io), 7 D4 (io), 8 D5 (io), 9 D6 (io), 10 D7 (io), 11 D8 (io), 12 D9 (io), 13 D10 (io), 14 MOSI (io), 15 MISO (io), 16 SCK (in), 17 A0 (in), 18 A1 (in), 19 A2 (in), 20 A3 (in), 21 VCC (power), 22 RST_1 (in), 23 GND_2 (power), 26 A5 (io), 27 A4 (io), 28 A7 (in), 29 A6 (in), 30 GND (power), 31 DTR (in), 32 TXO (io), 33 RXI (io), 34 VCC_1 (power), 35 GND (power), 36 RAW (power)

## ARDUINO_R3_ICSP
designator M?
footprint ARDUINOR3_ICSP
pins: 3V (power), 5V (power), 5V_ICSP 5V@1, A0, A1, A2, A3, A4 A4/SDA, A5 A5/SCL, AREF, D0, D1, D2, D3, D4, D5, D6, D7, D8, D9, D10, D11, D12, D13, GND (power), GND@1 GND@2 (power), GND@2 GND@3, GND@3 GND@1 (power), IOREF (out), MISO, MOSI, RESERVED, RESET /RESET, RESET_ICSP RST, SCK, SCL, SDA, VIN (power)

## ARDUINO_R3_ICSP_NODIM
designator M?
footprint ARDUINOR3_ICSP_NODIM
pins: 3V (power), 5V (power), 5V_ICSP 5V@1, A0, A1, A2, A3, A4 A4/SDA, A5 A5/SCL, AREF, D0, D1, D2, D3, D4, D5, D6, D7, D8, D9, D10, D11, D12, D13, GND (power), GND@1 GND@2 (power), GND@2 GND@3, GND@3 GND@1 (power), IOREF (out), MISO, MOSI, RESERVED, RESET /RESET, RESET_ICSP RST, SCK, SCL, SDA, VIN (power)

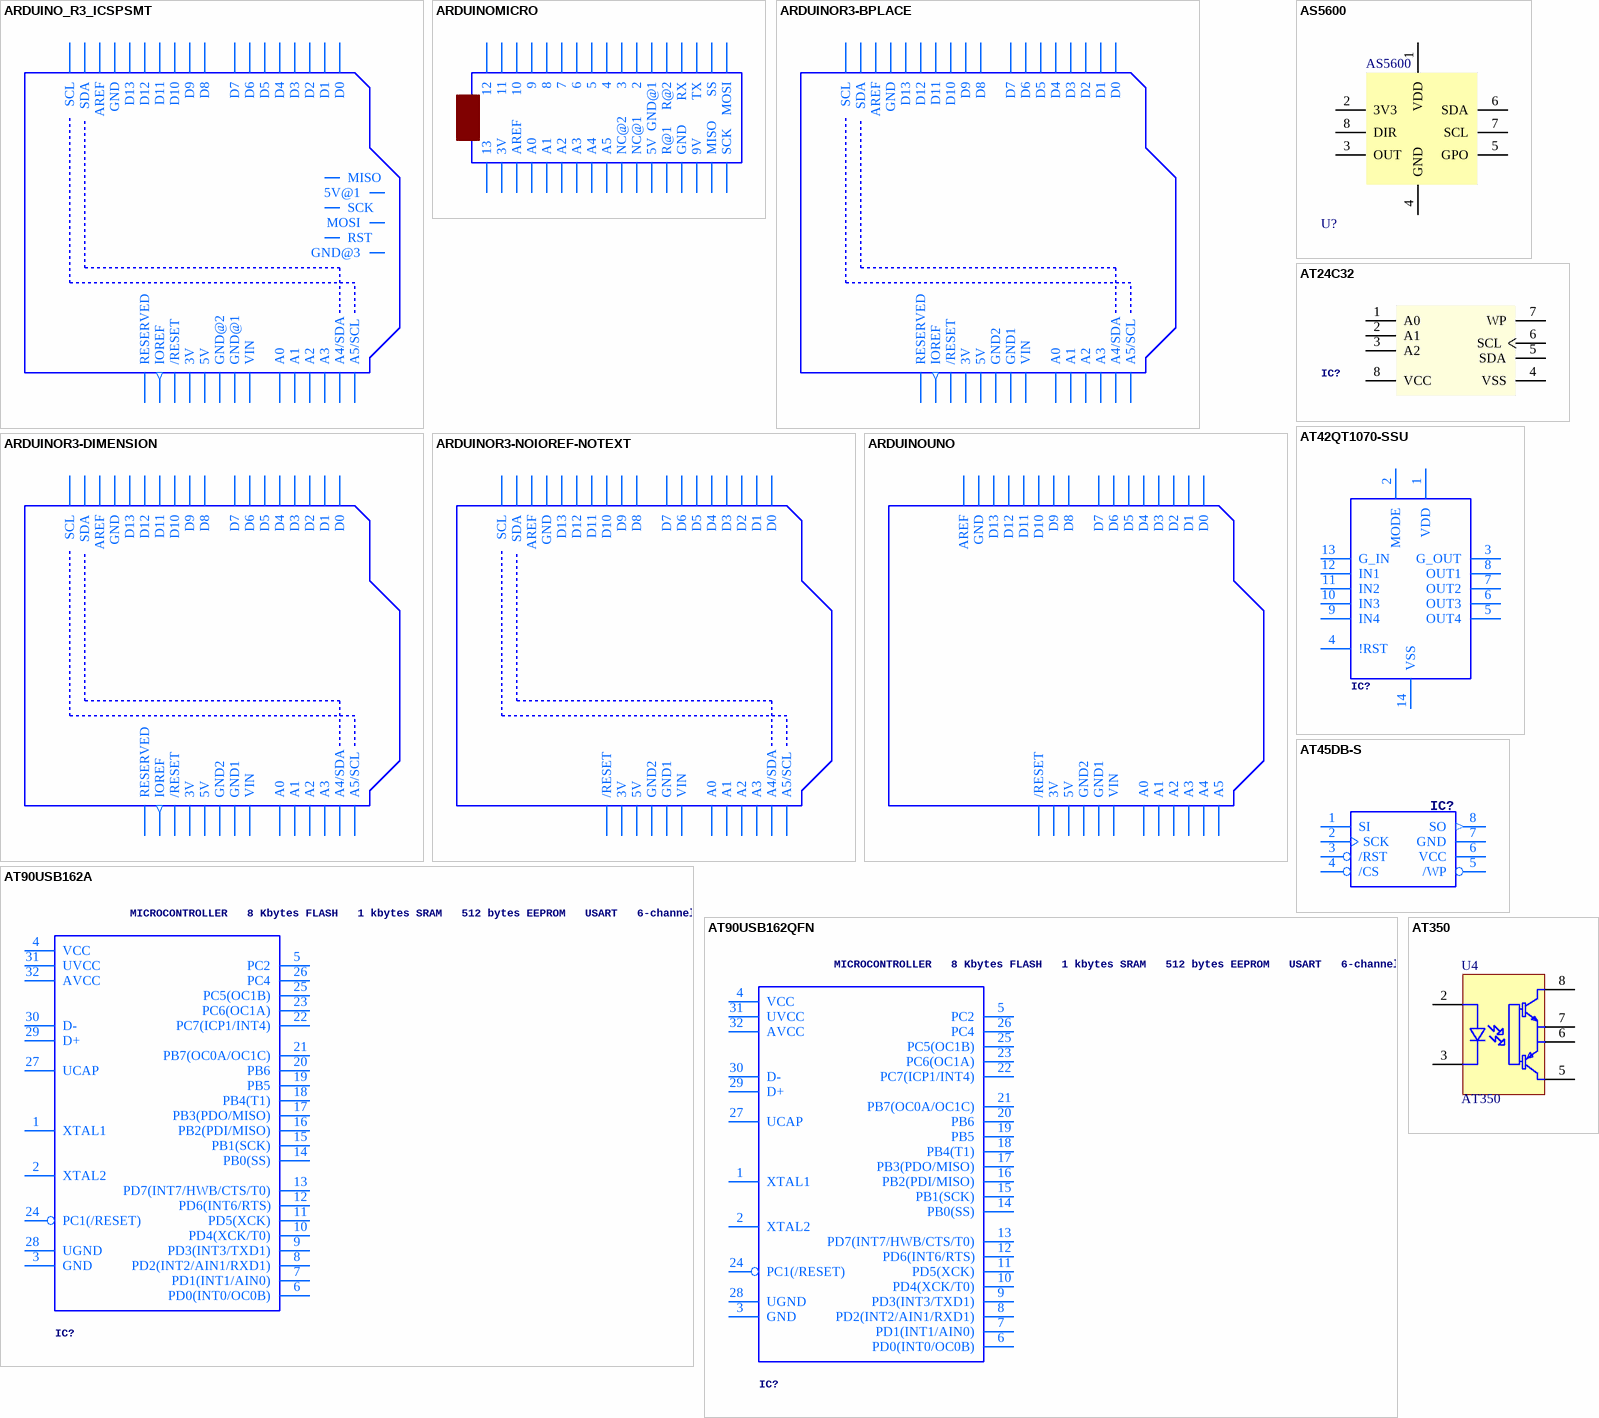
[diagram p3: symbols ARDUINO_R3_ICSPSMT to AT350]

## ARDUINO_R3_ICSPSMT
designator M?
footprint ARDUINOR3_ICSP_SMT
pins: 3V (power), 5V (power), 5V_ICSP 5V@1, A0, A1, A2, A3, A4 A4/SDA, A5 A5/SCL, AREF, D0, D1, D2, D3, D4, D5, D6, D7, D8, D9, D10, D11, D12, D13, GND (power), GND@1 (power), GND@2 (power), GND@3, IOREF (out), MISO, MOSI, RESERVED, RESET /RESET, RESET_ICSP RST, SCK, SCL, SDA, VIN (power)

## ARDUINOMICRO
designator ?
footprint ARDUINOMICRO
pins: P$1 12, P$2 11, P$3 10, P$4 9, P$5 8, P$6 7, P$7 6, P$8 5, P$9 4, P$10 3, P$11 2, P$12 GND, P$13 R@1, P$14 RX, P$15 TX, P$16 SS, P$17 MOSI, P$18 SCK, P$19 MISO, P$20 9V, P$21 GND@1, P$22 R@2, P$23 5V, P$24 NC@1, P$25 NC@2, P$26 A5, P$27 A4, P$28 A3, P$29 A2, P$30 A1, P$31 A0, P$32 AREF, P$33 3V, P$34 13

## ARDUINOR3-BPLACE
designator U?, comment This is a new object for the new Arduino R3 - with extra pins that you may want to use (such as IOref, and duplicated A4/A5  (value not drawn)
footprint ARDUINOR3-BPLACE
pins: 3V (power), 5V (power), A0, A1, A2, A3, A4 A4/SDA, A5 A5/SCL, AREF, D0, D1, D2, D3, D4, D5, D6, D7, D8, D9, D10, D11, D12, D13, GND (power), GND1 (power), GND2 (power), IOREF (out), RESERVED, RESET /RESET, SCL, SDA, VIN (power)
